# Altium footprint library Sigma_Library.PcbLib: 125 footprints (part 5 of 8)
Each footprint in its own frame and in the unit in brackets; x right, y up, seen from the top. Pads: shape width x height; smd on the part's side, far side on the other; paste and mask are expansions set on the pad; w line width, h text height; cw(c..) or ccw(c..) is an arc to the next point about the centre after c.
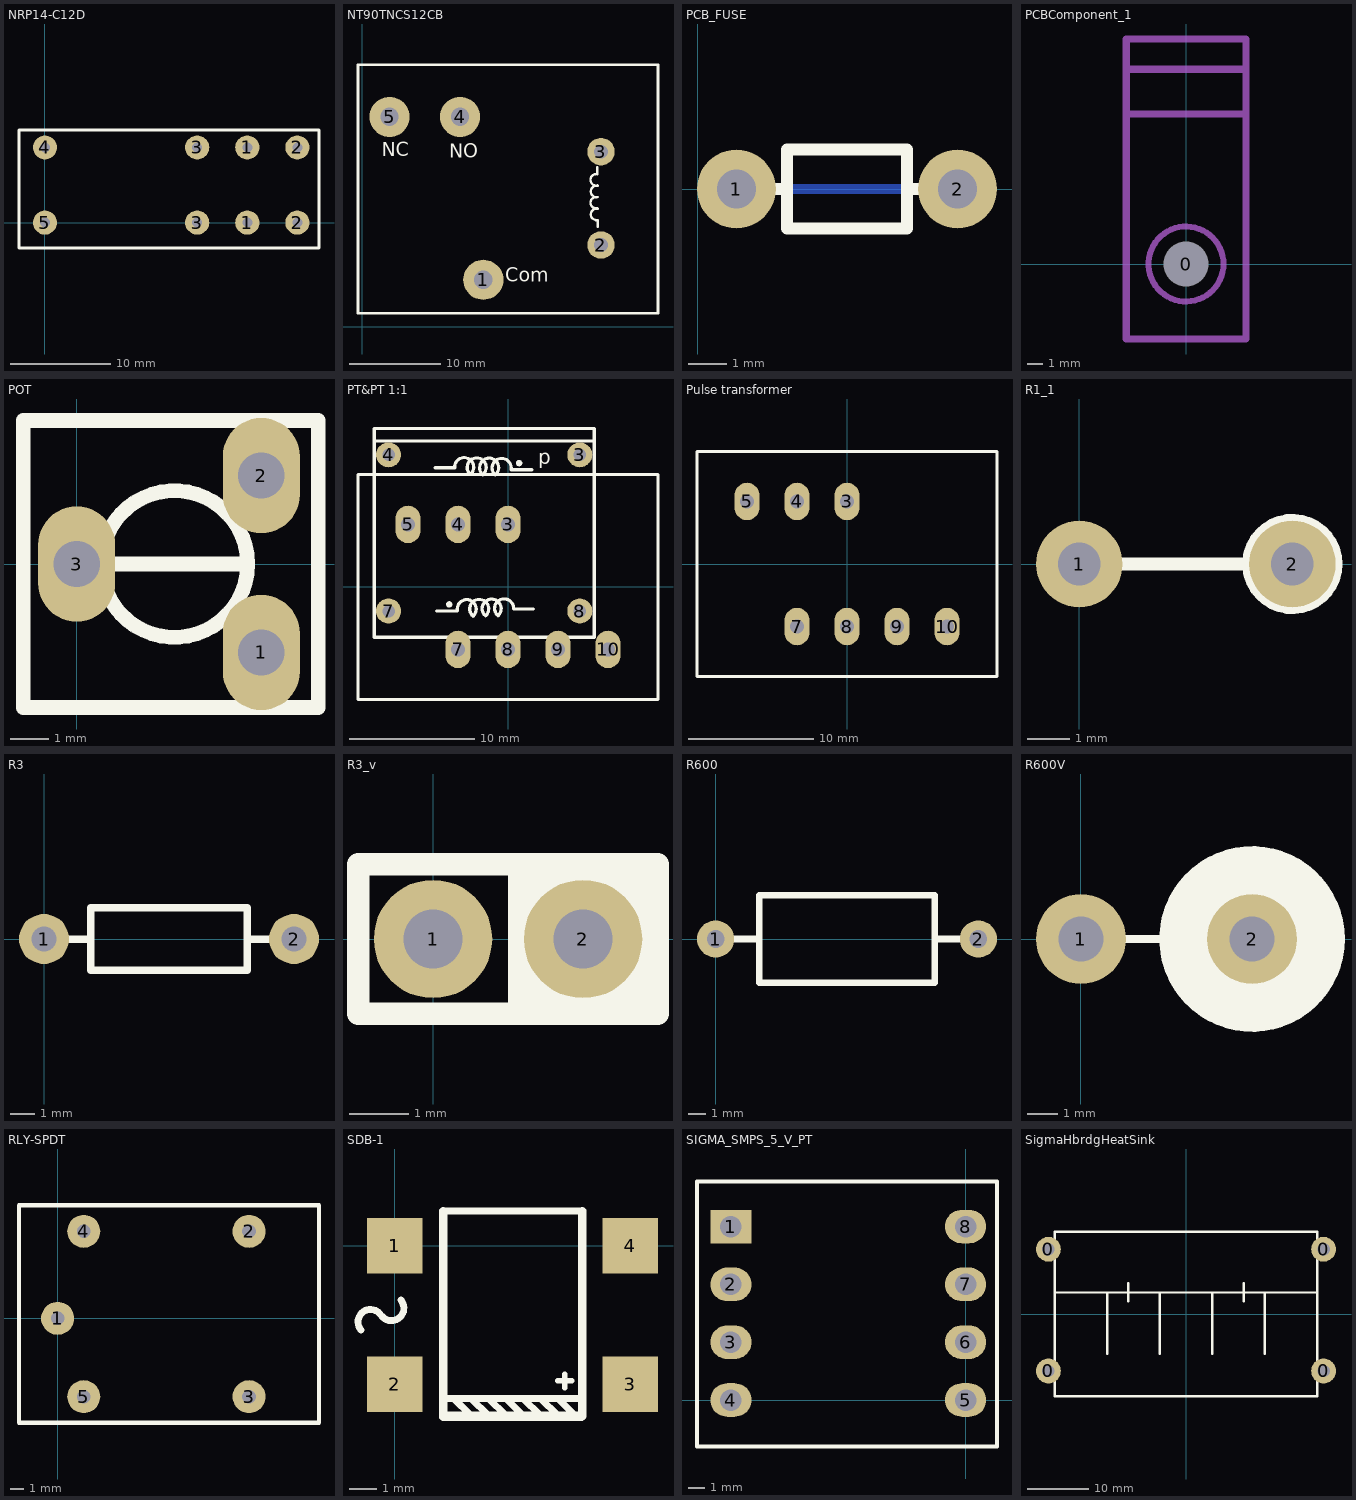
[diagram p4: the footprints below, top view; thin cyan lines are the x and y axes]

## NRP14-C12D [mm]
pads (8):
  round 2.413 hole 1: 1(20.2,0) 1(20.2,7.5) 2(25.2,0) 2(25.2,7.5) 3(15.2,0) 3(15.2,7.5) 4(0,7.5) 5(0,0)
Top Overlay:
  lines w0.305: -2.591,-2.54 -2.591,9.246 27.356,9.246 27.356,-2.54 -2.591,-2.54

## NT90TNCS12CB [mm]
pads (5):
  round 4.4 hole 2: 1(13.21,5.151) 4(10.67,22.951) 5(2.97,22.951)
  round 3 hole 1.5: 2(26.07,8.951) 3(26.07,19.151)
Top Overlay:
  lines w0.254: 25.664,16.817 25.664,17.467 ; 25.669,14.192 ccw(c25.544,13.577) 25.681,12.965 ; 25.669,16.692 ccw(c25.544,16.077) 25.681,15.465 ; 25.709,12.912 ccw(c25.584,12.297) 25.721,11.685 25.721,10.947 ; 25.709,15.422 ccw(c25.584,14.807) 25.721,14.195
  lines w0.305: -0.483,1.488 32.299,1.488 32.299,28.654 -0.483,28.654 -0.483,1.488
  text "Com" at 15.583,4.917 h1.52
  text "NC" at 2.121,18.633 h1.52
  text "NO" at 9.487,18.506 h1.52
3D body "AZ2100_1C-XXXX_POWER RELAY.STEP": height 27.94, standoff -3.56, extent -0.533,1.473 31.725,28.905

## PCB_FUSE [mil]
pads (2):
  round 80 hole 39.37: 1(39.37,0) 2(263.78,0)
Bottom Layer:
  lines w10: 39.37,0 263.78,0
Top Overlay:
  lines w12: 39.37,0 90.55,0 ; 212.6,0 263.78,0 ; 90.55,-40 90.55,40 212.6,40 212.6,-40 90.55,-40

## PCBComponent_1 [mm]
pads (1):
  round 2 hole 3: 0(0,0)
Mechanical 1:
  circle w0.4: c0,0 r2.5
  lines w0.5: -4,-5 4,-5 4,15 -4,15 -4,-5
Mechanical 13:
  lines w0.5: -4,10 4,10 ; -4,13 4,13

## POT [mm]
pads (3):
  oval 2x3 hole 1.2: 1(4.8,-2.3) 2(4.8,2.3) 3(0,0)
Top Overlay:
  circle w0.381: c2.54,0 r1.905
  lines w0.381: 0.635,0 4.445,0 ; -1.39,-3.73 -1.39,3.73 6.28,3.73 6.28,-3.73 -1.39,-3.73

## PT&PT 1:1 [mm] "Sigma_Pulse_Transformer / Or shufner"
height 22
pads (11):
  oval 2x3 hole 1.1: 3(0,5) 4(-4,5) 5(-8,5) 7(-4,-5) 8(0,-5) 9(4,-5) 10(8,-5)
  round 2 hole 1: 3(5.745,10.568) 4(-9.555,10.568) 7(-9.555,-1.932) 8(5.745,-1.932)
Top Overlay:
  circle w0.254: c-4.699,-1.397 r0.127
  circle w0.254: c0.889,9.906 r0.127
  lines w0.254: -10.705,11.668 6.895,11.668 ; -5.831,9.536 -4.263,9.536 cw(c-3.503,9.584) -3.015,8.999 cw(c-2.505,9.564) -2.017,8.979 cw(c-1.506,9.545) -1.018,8.959 cw(c-0.508,9.525) 0.246,9.417 ; -5.715,-1.924 -4.056,-1.924 ; -4.056,-1.886 cw(c-3.302,-1.778) -2.792,-2.344 cw(c-2.304,-1.758) -1.793,-2.324 cw(c-1.305,-1.739) -0.795,-2.304 cw(c-0.307,-1.719) 0.453,-1.767 2.021,-1.767 ; 0.246,9.379 1.905,9.379 ; -12,-9 12,-9 12,9 -12,9 -12,-9 ; -10.705,-4.032 -10.705,12.668 6.895,12.668 6.895,-4.032 -10.705,-4.032
  text "p" at 2.413,9.398 h2
3D body: height 6, standoff 0, extent -11.99,-9.08 11.99,8.92
3D body: height 22, standoff 1, extent -11.99,-3.58 12,3.3

## Pulse transformer [mm] "Sigma_Pulse_Transformer-pushpull"
height 22
pads (7):
  oval 2x3 hole 1.1: 3(0,5) 4(-4,5) 5(-8,5) 7(-4,-5) 8(0,-5) 9(4,-5) 10(8,-5)
Top Overlay:
  lines w0.254: -12,-9 -12,9 12,9 12,-9 -12,-9
3D body: height 22, standoff 1, extent -11.99,-3.58 12,3.3
3D body: height 6, standoff 0, extent -11.99,-9.08 11.99,8.92

## R1_1 [mil]
pads (2):
  round 80 hole 39.37: 1(0,0) 2(196.85,0)
Top Overlay:
  circle w12: c196.85,0 r40.31
  lines w12: 0,0 196.85,0
3D body "RES-0.25W-V-CF.stp": height 374.08, standoff -98.43, extent 0.04,-42.36 211.96,60

## R3 [mil]
pads (2):
  round 80 hole 39.37: 1(0,0) 2(400,0)
Top Overlay:
  lines w12: 0,0 75,0 ; 325,0 400,0 ; 75,-50 75,50 325,50 325,-50 75,-50
3D body "RES-0.25W-H-CF.stp": height 106.3, standoff -98.43, extent -10.82,-50.18 410.74,52.18

## R3_v [mil]
pads (2):
  round 79 hole 39.37: 1(0,0) 2(100,0)
Top Overlay:
  rectangle: 50,-50 150,50
  lines w15: -50,-50 150,-50 150,50 -50,50 -50,-50
3D body "RES-0.25W-V-CF.stp": height 374.08, standoff -98.43, extent -42.96,-46 168.96,56.36

## R600 [mil]
pads (2):
  round 85 hole 40: 1(0,0) 2(600,0)
Top Overlay:
  lines w15: 0,0 100,0 ; 500,0 600,0 ; 100,-100 100,100 500,100 500,-100 100,-100
3D body "RES-1W-H-MO.stp": height 279.53, standoff -19.68, extent -40.62,-98.33 640.76,98.34

## R600V [mm]
pads (2):
  round 3 hole 1.5: 1(0,0) 2(5.715,0)
Top Overlay:
  circle w0.6: c5.715,0 r2.8
  region: 3.175,0 3.175,-0.25 3.273,-0.741 3.464,-1.203 3.742,-1.619 4.096,-1.973 4.512,-2.251 4.974,-2.442 5.465,-2.54 5.715,-2.54 5.965,-2.54 6.456,-2.442 6.918,-2.251 7.334,-1.973 7.688,-1.619 7.966,-1.203 8.157,-0.741 8.255,-0.25 8.255,0 8.255,0.25 8.157,0.741 7.966,1.203 7.688,1.619 7.334,1.973 6.918,2.251 6.456,2.442 5.965,2.54 5.715,2.54 5.465,2.54 4.974,2.442 4.512,2.251 4.096,1.973 3.742,1.619 3.464,1.203 3.273,0.741 3.175,0.25
  lines w0.254: 0,0 4.801,0
3D body "RES-1W-V-MO.stp": height 16.25, standoff -2.5, extent 0.1,-2.083 8.077,2.917

## RLY-SPDT [mil]
pads (5):
  round 95 hole 39.37: 1(0,0) 2(550,250) 3(550,-225) 4(75,250) 5(75,-225)
Top Overlay:
  lines w12: -111,-300 -111,325 751,325 751,-300 -111,-300
3D body "PANASONIC RELAY AUTO MINI SPDT 15A 12VDC - JSM1-12V-5.STEP": height 629.92, standoff -153.54, extent -115.07,-302.96 751.07,326.96

## SDB-1 [mil]
pads (4):
  rect 80x80 smd: 1(0,0) 2(0,-200) 3(339.37,-200) 4(339.37,0)
Top Overlay:
  lines w7.87: 235,-195 255,-195 ; 245,-205 245,-185
  lines w10: -48.81,-121.59 cw(c-35,-110) -21.19,-98.41 ; -18.81,-101.59 ccw(c-5,-90) 8.81,-78.41 ; 70,-220 270,-220 ; 70,50 270,50 ; 85,-220 110,-245 ; 110,-220 135,-245 ; 135,-220 160,-245 ; 160,-220 185,-245 ; 185,-220 210,-245 ; 210,-220 235,-245 ; 235,-220 260,-245
  lines w12: 70,-245 145,-245 ; 70,50 70,-247 120,-247 220,-247 269,-247 270,-246 270,50 ; 125,-245 270,-245
3D body "SDIP4L.stp": height 143.72, standoff 1.38, extent -35.63,-268.05 367.62,66.07

## SIGMA_SMPS_5_V_PT [mm] "Sigma_Pulse_Transformer"
pads (8):
  rect 2.5x2.032 hole 1.3: 1(-14.2,10.5)
  oval 2.5x2.032 hole 1.3: 2(-14.2,7) 3(-14.2,3.5) 4(-14.2,0) 5(0,0) 6(0,3.5) 7(0,7) 8(0,10.5)
Top Overlay:
  lines w0.254: -16.256,-2.819 1.905,-2.819 1.905,13.233 -16.256,13.233 -16.256,-2.819
3D body: height 3, standoff 1, extent -16.129,-2.794 1.905,13.208

## SigmaHbrdgHeatSink [mil]
height 2160
pads (4):
  round 160 hole 80: 0(-886.2,-367.05) 0(-886.2,417.05) 0(886.2,-367.05) 0(886.2,417.05)
Top Overlay:
  lines w15: -846.2,139 846.2,139 ; -507.7,-255 -507.7,139 ; -371.5,80 -371.5,200 ; -169.2,-255 -169.2,139 ; 169.2,-255 169.2,139 ; 371.5,80 371.5,200 ; 507.7,-255 507.7,139 ; -846.2,-529 846.2,-529 846.2,529 -846.2,529 -846.2,-529
3D body: height 2165.35, standoff 196.85, extent -855.5,-534 849.5,536